# Altium footprint library PartsDatabaseV16.1.PcbLib: 145 footprints (part 4 of 10)
Each footprint in its own frame and in the unit in brackets; x right, y up, seen from the top. Pads: shape width x height; smd on the part's side, far side on the other; paste and mask are expansions set on the pad; w line width, h text height; cw(c..) or ccw(c..) is an arc to the next point about the centre after c.
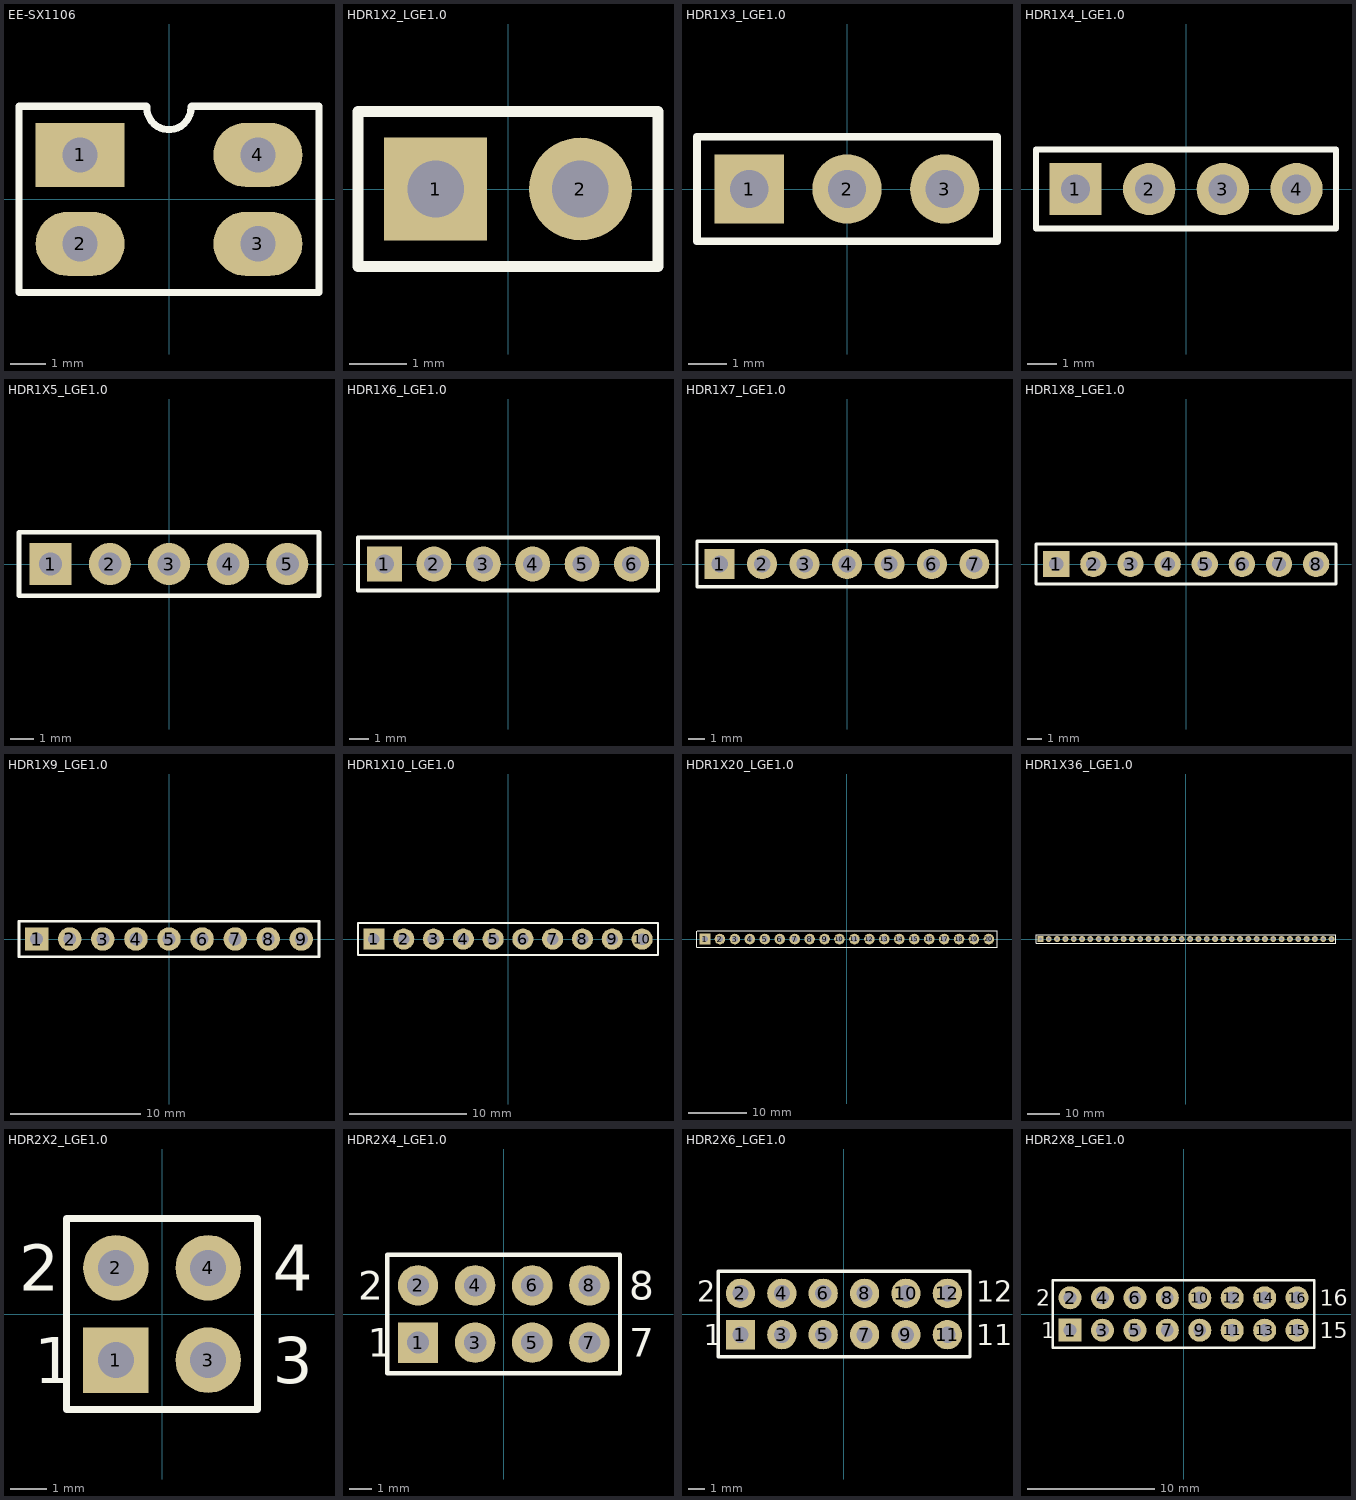
[diagram p3: the footprints below, top view; thin cyan lines are the x and y axes]

## EE-SX1106 [mm]
pads (4):
  rect 2.5x1.8 hole 0.991: 1(-2.5,1.25)
  oval 2.5x1.8 hole 0.991: 2(-2.5,-1.25) 3(2.5,-1.25) 4(2.5,1.25)
Top Overlay:
  lines w0.2: -0.622,2.578 ccw(c-0.001,2.578) 0.62,2.58 ; -0.622,2.603 -0.635,2.616 -4.216,2.616 -4.216,-2.616 4.216,-2.616 4.216,2.616 0.635,2.616 0.622,2.603

## HDR1X2_LGE1.0 [mm] "Connector; Header; 2 Position"
pads (2):
  rect 1.8x1.8 hole 0.991: 1(-1.27,0)
  round 1.8 hole 0.991: 2(1.27,0)
Top Overlay:
  lines w0.2: -2.629,-1.359 -2.629,1.359 2.629,1.359 2.629,-1.359 -2.629,-1.359
3D body "Header1x2.STEP": height 8.54, standoff -3, extent -2.54,-1.245 2.54,1.245

## HDR1X3_LGE1.0 [mm] "Connector; Header; 4 Position"
pads (3):
  rect 1.8x1.8 hole 0.991: 1(-2.54,0)
  round 1.8 hole 0.991: 2(0,0) 3(2.54,0)
Top Overlay:
  lines w0.2: -3.899,-1.359 -3.899,1.359 3.899,1.359 3.899,-1.359 -3.899,-1.359
3D body "Header1x3.step": height 8.54, standoff -3, extent -3.797,-1.232 3.823,1.258

## HDR1X4_LGE1.0 [mm] "Connector; Header; 4 Position"
pads (4):
  rect 1.8x1.8 hole 0.991: 1(-3.81,0)
  round 1.8 hole 0.991: 2(-1.27,0) 3(1.27,0) 4(3.81,0)
Top Overlay:
  lines w0.2: -5.169,-1.359 -5.169,1.359 5.169,1.359 5.169,-1.359 -5.169,-1.359
3D body "Header1x4.STEP": height 8.54, standoff -3, extent -4.953,-1.245 5.207,1.245

## HDR1X5_LGE1.0 [mm] "Connector; Header; 6 Position"
pads (5):
  rect 1.8x1.8 hole 0.991: 1(-5.08,0)
  round 1.8 hole 0.991: 2(-2.54,0) 3(0,0) 4(2.54,0) 5(5.08,0)
Top Overlay:
  lines w0.2: -6.439,-1.359 -6.439,1.359 6.439,1.359 6.439,-1.359 -6.439,-1.359
3D body "Header1x5.STEP": height 8.54, standoff -3, extent -6.223,-1.245 6.477,1.245

## HDR1X6_LGE1.0 [mm] "Connector; Header; 6 Position"
pads (6):
  rect 1.8x1.8 hole 0.991: 1(-6.35,0)
  round 1.8 hole 0.991: 2(-3.81,0) 3(-1.27,0) 4(1.27,0) 5(3.81,0) 6(6.35,0)
Top Overlay:
  lines w0.2: -7.709,-1.359 7.709,-1.359 7.709,1.359 -7.709,1.359 -7.709,-1.359
3D body "Header1x6.STEP": height 8.54, standoff -3, extent -7.594,-1.245 7.646,1.245

## HDR1X7_LGE1.0 [mm] "Connector; Header; 8 Position"
pads (7):
  rect 1.8x1.8 hole 0.991: 1(-7.62,0)
  round 1.8 hole 0.991: 2(-5.08,0) 3(-2.54,0) 4(0,0) 5(2.54,0) 6(5.08,0) 7(7.62,0)
Top Overlay:
  lines w0.2: -8.979,-1.359 8.979,-1.359 8.979,1.359 -8.979,1.359 -8.979,-1.359
3D body "Header1x7.STEP": height 8.54, standoff -3, extent -8.89,-1.245 8.89,1.245

## HDR1X8_LGE1.0 [mm] "Connector; Header; 8 Position"
pads (8):
  rect 1.8x1.8 hole 0.991: 1(-8.89,0)
  round 1.8 hole 0.991: 2(-6.35,0) 3(-3.81,0) 4(-1.27,0) 5(1.27,0) 6(3.81,0) 7(6.35,0) 8(8.89,0)
Top Overlay:
  lines w0.2: -10.274,-1.359 -10.274,1.359 10.249,1.359 10.249,-1.359 -10.274,-1.359
3D body "Header1x8.STEP": height 8.54, standoff -3, extent -10.134,-1.245 10.186,1.245

## HDR1X9_LGE1.0 [mm] "Connector; Header; 10 Position"
pads (9):
  rect 1.8x1.8 hole 0.991: 1(-10.16,0)
  round 1.8 hole 0.991: 2(-7.62,0) 3(-5.08,0) 4(-2.54,0) 5(0,0) 6(2.54,0) 7(5.08,0) 8(7.62,0) 9(10.16,0)
Top Overlay:
  lines w0.2: -11.519,-1.359 11.519,-1.359 11.519,1.359 -11.519,1.359 -11.519,-1.359
3D body "Header1x9.STEP": height 8.54, standoff -3, extent -11.455,-1.245 11.405,1.245

## HDR1X10_LGE1.0 [mm] "Connector; Header; 10 Position"
pads (10):
  rect 1.8x1.8 hole 0.991: 1(-11.43,0)
  round 1.8 hole 0.991: 2(-8.89,0) 3(-6.35,0) 4(-3.81,0) 5(-1.27,0) 6(1.27,0) 7(3.81,0) 8(6.35,0) 9(8.89,0) 10(11.43,0)
Top Overlay:
  lines w0.2: -12.789,1.359 -12.789,-1.359 12.789,-1.359 12.789,1.372 -12.763,1.372
3D body "Header1x10.STEP": height 8.54, standoff -3, extent -12.7,-1.245 12.7,1.245

## HDR1X20_LGE1.0 [mm] "Connector; Header; 20 Position"
pads (20):
  rect 1.8x1.8 hole 0.991: 1(-24.13,0)
  round 1.8 hole 0.991: 2(-21.59,0) 3(-19.05,0) 4(-16.51,0) 5(-13.97,0) 6(-11.43,0) 7(-8.89,0) 8(-6.35,0) 9(-3.81,0) 10(-1.27,0) 11(1.27,0) 12(3.81,0) 13(6.35,0) 14(8.89,0) 15(11.43,0) 16(13.97,0) 17(16.51,0) 18(19.05,0) 19(21.59,0) 20(24.13,0)
Top Overlay:
  lines w0.2: -25.489,1.359 -25.489,-1.359 25.502,-1.359 25.502,1.372 -25.463,1.372
3D body "Header1x10.STEP": height 8.54, standoff -3, extent 0,-1.245 25.4,1.245
3D body "Header1x10.STEP": height 8.54, standoff -3, extent -25.4,-1.245 0,1.245

## HDR1X36_LGE1.0 [mm] "Connector; Header; 36 Position"
pads (36):
  rect 1.8x1.8 hole 0.991: 1(-44.45,0)
  round 1.8 hole 0.991: 2(-41.91,0) 3(-39.37,0) 4(-36.83,0) 5(-34.29,0) 6(-31.75,0) 7(-29.21,0) 8(-26.67,0) 9(-24.13,0) 10(-21.59,0) 11(-19.05,0) 12(-16.51,0) 13(-13.97,0) 14(-11.43,0) 15(-8.89,0) 16(-6.35,0) 17(-3.81,0) 18(-1.27,0) 19(1.27,0) 20(3.81,0) 21(6.35,0) 22(8.89,0) 23(11.43,0) 24(13.97,0) 25(16.51,0) 26(19.05,0) 27(21.59,0) 28(24.13,0) 29(26.67,0) 30(29.21,0) 31(31.75,0) 32(34.29,0) 33(36.83,0) 34(39.37,0) 35(41.91,0) 36(44.45,0)
Top Overlay:
  lines w0.2: -45.809,1.359 -45.809,-1.359 45.822,-1.359 45.822,1.372 -45.783,1.372
3D body "Header1x10.STEP": height 8.54, standoff -3, extent -45.72,-1.245 -20.32,1.245
3D body "Header1x10.STEP": height 8.54, standoff -3, extent -20.32,-1.245 5.08,1.245
3D body "Header1x10.STEP": height 8.54, standoff -3, extent 5.08,-1.245 30.48,1.245
3D body "Header1x10.STEP": height 8.54, standoff -3, extent 20.32,-1.245 45.72,1.245

## HDR2X2_LGE1.0 [mm] "Connector; Header; 2x2 Position"
pads (4):
  rect 1.8x1.8 hole 0.991: 1(-1.27,-1.27)
  round 1.8 hole 0.991: 2(-1.27,1.27) 3(1.27,-1.27) 4(1.27,1.27)
Top Overlay:
  lines w0.2: -2.629,-2.629 2.629,-2.629 2.629,2.629 -2.629,2.629 -2.629,-2.629
  text "3" at 3.048,-1.905 h1.27
  text "4" at 3.048,0.635 h1.27
  text "2" at -3.937,0.635 h1.27
  text "1" at -3.514,-1.905 h1.27
3D body "Header1x2.STEP": height 8.54, standoff -3, extent -2.54,-2.515 2.54,-0.025
3D body "Header1x2.STEP": height 8.54, standoff -3, extent -2.553,0.012 2.527,2.502

## HDR2X4_LGE1.0 [mm] "Connector; Header; 4x2 Position"
pads (8):
  rect 1.8x1.8 hole 0.991: 1(-3.81,-1.27)
  round 1.8 hole 0.991: 2(-3.81,1.27) 3(-1.27,-1.27) 4(-1.27,1.27) 5(1.27,-1.27) 6(1.27,1.27) 7(3.81,-1.27) 8(3.81,1.27)
Top Overlay:
  lines w0.2: -5.169,-2.629 5.169,-2.629 5.169,2.629 -5.169,2.629 -5.169,-2.629
  text "2" at -6.477,0.635 h1.27
  text "1" at -6.054,-1.905 h1.27
  text "7" at 5.588,-1.905 h1.27
  text "8" at 5.588,0.635 h1.27
3D body "Header1x4.STEP": height 8.54, standoff -3, extent -5.08,0.05 5.08,2.54
3D body "Header1x4.STEP": height 8.54, standoff -3, extent -5.08,-2.515 5.08,-0.025

## HDR2X6_LGE1.0 [mm] "Connector; Header; 6x2 Position"
pads (12):
  rect 1.8x1.8 hole 0.991: 1(-6.35,-1.27)
  round 1.8 hole 0.991: 2(-6.35,1.27) 3(-3.81,-1.27) 4(-3.81,1.27) 5(-1.27,-1.27) 6(-1.27,1.27) 7(1.27,-1.27) 8(1.27,1.27) 9(3.81,-1.27) 10(3.81,1.27) 11(6.35,-1.27) 12(6.35,1.27)
Top Overlay:
  lines w0.2: -7.709,-2.629 -7.709,2.629 7.747,2.629 7.747,-2.629 -7.709,-2.629
  text "2" at -9.017,0.762 h1.27
  text "1" at -8.594,-1.905 h1.27
  text "11" at 8.128,-1.905 h1.27
  text "12" at 8.128,0.762 h1.27
3D body "Header1x6.STEP": height 8.54, standoff -3, extent -7.595,0 7.645,2.49
3D body "Header1x6.STEP": height 8.54, standoff -3, extent -7.595,-2.515 7.645,-0.025

## HDR2X8_LGE1.0 [mm] "Connector; Header; 8x2 Position"
pads (16):
  rect 1.8x1.8 hole 0.991: 1(-8.89,-1.27)
  round 1.8 hole 0.991: 2(-8.89,1.27) 3(-6.35,-1.27) 4(-6.35,1.27) 5(-3.81,-1.27) 6(-3.81,1.27) 7(-1.27,-1.27) 8(-1.27,1.27) 9(1.27,-1.27) 10(1.27,1.27) 11(3.81,-1.27) 12(3.81,1.27) 13(6.35,-1.27) 14(6.35,1.27) 15(8.89,-1.27) 16(8.89,1.27)
Top Overlay:
  lines w0.2: -10.249,-2.629 -10.249,2.629 10.249,2.629 10.249,-2.629 -10.249,-2.629
  text "2" at -11.557,0.635 h1.27
  text "1" at -11.134,-1.905 h1.27
  text "15" at 10.668,-1.905 h1.27
  text "16" at 10.668,0.635 h1.27
3D body "Header1x8.STEP": height 8.54, standoff -3, extent -10.135,0.025 10.185,2.515
3D body "Header1x8.STEP": height 8.54, standoff -3, extent -10.134,-2.515 10.186,-0.025